# Altium footprint library LPC1788.PCBLIB: 33 footprints (part 2 of 3)
Each footprint in its own frame and in the unit in brackets; x right, y up, seen from the top. Pads: shape width x height; smd on the part's side, far side on the other; paste and mask are expansions set on the pad; w line width, h text height; cw(c..) or ccw(c..) is an arc to the next point about the centre after c.
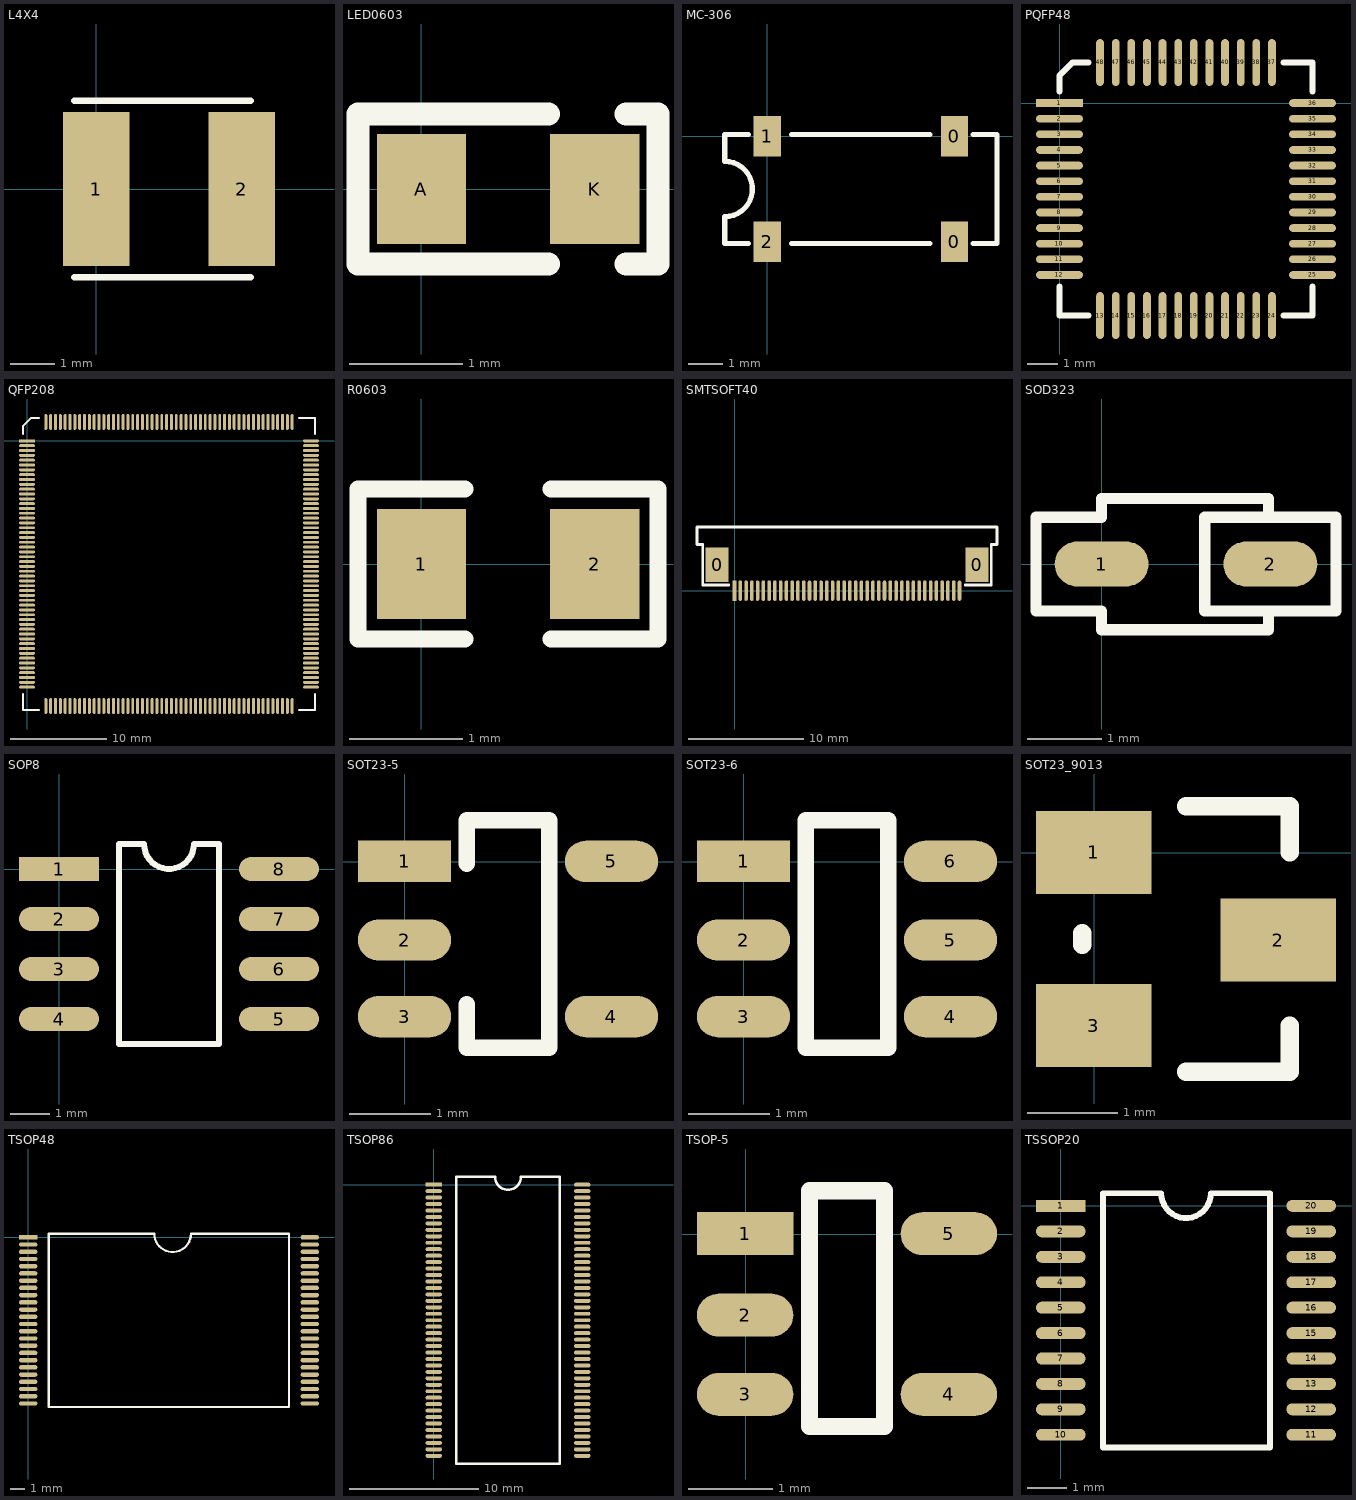
[diagram p1: the footprints below, top view; thin cyan lines are the x and y axes]

## L4X4 [mm]
pads (2):
  rect 1.5x3.5 smd: 1(0,0) 2(3.3,0)
TopOverlay:
  lines w0.152: -0.5,-2 3.5,-2 ; -0.5,2 3.5,2
3D body: height 1.04, standoff 0.02, extent -0.35,-2 3.65,2

## LED0603 [mil]
pads (2):
  rect 31x38 smd: A(0,0) K(60,0)
TopOverlay:
  lines w8: 44,-26 -22,-26 -22,26 44,26 ; 71,-26 82,-26 82,26 71,26
3D body: height 35.43, standoff 0, extent -3.46,-17.71 63.47,17.72

## MC-306 [mm]
pads (4):
  rect 0.8x1.2 smd: 0(5.496,-3.095) 0(5.496,0.005) 1(-0.004,0.005) 2(-0.004,-3.095)
TopOverlay:
  lines w0.152: -0.556,-3.145 -1.254,-3.145 -1.254,-2.359 ccw(c-1.254,-1.545) -1.254,-0.731 -1.254,0.055 -0.556,0.055 ; 0.714,-3.145 4.778,-3.145 ; 0.714,0.055 4.778,0.055 ; 6.048,-3.145 6.746,-3.145 6.746,0.055 6.048,0.055
3D body: height -0.39, standoff -2.8, extent -1.231,-3.248 6.769,0.152

## PQFP48 [mil]
pads (48):
  rect 60x10 smd: 1(-0.17,0.2)
  oval 60x10 smd: 2(-0.17,-19.8) 3(-0.17,-39.8) 4(-0.17,-59.8) 5(-0.17,-79.8) 6(-0.17,-99.8) 7(-0.17,-119.8) 8(-0.17,-139.8) 9(-0.17,-159.8) 10(-0.17,-179.8) 11(-0.17,-199.8) 12(-0.17,-219.8) 25(323.83,-219.8) 26(323.83,-199.8) 27(323.83,-179.8) 28(323.83,-159.8) 29(323.83,-139.8) 30(323.83,-119.8) 31(323.83,-99.8) 32(323.83,-79.8) 33(323.83,-59.8) 34(323.83,-39.8) 35(323.83,-19.8) 36(323.83,0.2)
  oval 10x60 smd: 13(51.83,-271.8) 14(71.83,-271.8) 15(91.83,-271.8) 16(111.83,-271.8) 17(131.83,-271.8) 18(151.83,-271.8) 19(171.83,-271.8) 20(191.83,-271.8) 21(211.83,-271.8) 22(231.83,-271.8) 23(251.83,-271.8) 24(271.83,-271.8) 37(271.83,52.2) 38(251.83,52.2) 39(231.83,52.2) 40(211.83,52.2) 41(191.83,52.2) 42(171.83,52.2) 43(151.83,52.2) 44(131.83,52.2) 45(111.83,52.2) 46(91.83,52.2) 47(71.83,52.2) 48(51.83,52.2)
TopOverlay:
  lines w8: -0.17,-234.8 -0.17,-271.8 36.83,-271.8 ; -0.17,15.2 -0.17,35.2 16.83,52.2 36.83,52.2 ; 286.83,-271.8 323.83,-271.8 323.83,-234.8 ; 286.83,52.2 323.83,52.2 323.83,15.2
3D body: height 57.09, standoff -0.39, extent -15.33,-286.17 339,68.17

## QFP208 [mil]
pads (208):
  rect 65x12 smd: 1(-0.17,0.2)
  oval 65x12 smd: 2(-0.17,-19.48) 3(-0.17,-39.17) 4(-0.17,-58.85) 5(-0.17,-78.54) 6(-0.17,-98.22) 7(-0.17,-117.91) 8(-0.17,-137.59) 9(-0.17,-157.28) 10(-0.17,-176.96) 11(-0.17,-196.65) 12(-0.17,-216.33) 13(-0.17,-236.02) 14(-0.17,-255.7) 15(-0.17,-275.39) 16(-0.17,-295.07) 17(-0.17,-314.76) 18(-0.17,-334.44) 19(-0.17,-354.13) 20(-0.17,-373.81) 21(-0.17,-393.5) 22(-0.17,-413.18) 23(-0.17,-432.87) 24(-0.17,-452.55) 25(-0.17,-472.24) 26(-0.17,-491.92) 27(-0.17,-511.61) 28(-0.17,-531.29) 29(-0.17,-550.98) 30(-0.17,-570.66) 31(-0.17,-590.35) 32(-0.17,-610.03) 33(-0.17,-629.72) 34(-0.17,-649.4) 35(-0.17,-669.09) 36(-0.17,-688.77) 37(-0.17,-708.46) 38(-0.17,-728.14) 39(-0.17,-747.83) 40(-0.17,-767.51) 41(-0.17,-787.2) 42(-0.17,-806.88) 43(-0.17,-826.57) 44(-0.17,-846.25) 45(-0.17,-865.94) 46(-0.17,-885.62) 47(-0.17,-905.31) 48(-0.17,-924.99) 49(-0.17,-944.68) 50(-0.17,-964.36) 51(-0.17,-984.05) 52(-0.17,-1003.73) 105(1157.3,-1003.73) 106(1157.3,-984.05) 107(1157.3,-964.36) 108(1157.3,-944.68) 109(1157.3,-924.99) 110(1157.3,-905.31) 111(1157.3,-885.62) 112(1157.3,-865.94) 113(1157.3,-846.25) 114(1157.3,-826.57) 115(1157.3,-806.88) 116(1157.3,-787.2) 117(1157.3,-767.51) 118(1157.3,-747.83) 119(1157.3,-728.14) 120(1157.3,-708.46) 121(1157.3,-688.77) 122(1157.3,-669.09) 123(1157.3,-649.4) 124(1157.3,-629.72) 125(1157.3,-610.03) 126(1157.3,-590.35) 127(1157.3,-570.66) 128(1157.3,-550.98) 129(1157.3,-531.29) 130(1157.3,-511.61) 131(1157.3,-491.92) 132(1157.3,-472.24) 133(1157.3,-452.55) 134(1157.3,-432.87) 135(1157.3,-413.18) 136(1157.3,-393.5) 137(1157.3,-373.81) 138(1157.3,-354.13) 139(1157.3,-334.44) 140(1157.3,-314.76) 141(1157.3,-295.07) 142(1157.3,-275.39) 143(1157.3,-255.7) 144(1157.3,-236.02) 145(1157.3,-216.33) 146(1157.3,-196.65) 147(1157.3,-176.96) 148(1157.3,-157.28) 149(1157.3,-137.59) 150(1157.3,-117.91) 151(1157.3,-98.22) 152(1157.3,-78.54) 153(1157.3,-58.85) 154(1157.3,-39.17) 155(1157.3,-19.48) 156(1157.3,0.2)
  oval 12x65 smd: 53(76.6,-1080.5) 54(96.28,-1080.5) 55(115.97,-1080.5) 56(135.65,-1080.5) 57(155.34,-1080.5) 58(175.02,-1080.5) 59(194.71,-1080.5) 60(214.39,-1080.5) 61(234.08,-1080.5) 62(253.76,-1080.5) 63(273.45,-1080.5) 64(293.13,-1080.5) 65(312.82,-1080.5) 66(332.5,-1080.5) 67(352.19,-1080.5) 68(371.87,-1080.5) 69(391.56,-1080.5) 70(411.24,-1080.5) 71(430.93,-1080.5) 72(450.61,-1080.5) 73(470.3,-1080.5) 74(489.98,-1080.5) 75(509.67,-1080.5) 76(529.35,-1080.5) 77(549.04,-1080.5) 78(568.72,-1080.5) 79(588.41,-1080.5) 80(608.09,-1080.5) 81(627.78,-1080.5) 82(647.46,-1080.5) 83(667.15,-1080.5) 84(686.83,-1080.5) 85(706.52,-1080.5) 86(726.2,-1080.5) 87(745.89,-1080.5) 88(765.57,-1080.5) 89(785.26,-1080.5) 90(804.94,-1080.5) 91(824.63,-1080.5) 92(844.31,-1080.5) 93(864,-1080.5) 94(883.68,-1080.5) 95(903.37,-1080.5) 96(923.05,-1080.5) 97(942.74,-1080.5) 98(962.42,-1080.5) 99(982.11,-1080.5) 100(1001.79,-1080.5) 101(1021.48,-1080.5) 102(1041.16,-1080.5) 103(1060.85,-1080.5) 104(1080.53,-1080.5) 157(1080.53,76.98) 158(1060.85,76.98) 159(1041.16,76.98) 160(1021.48,76.98) 161(1001.79,76.98) 162(982.11,76.98) 163(962.42,76.98) 164(942.74,76.98) 165(923.05,76.98) 166(903.37,76.98) 167(883.68,76.98) 168(864,76.98) 169(844.31,76.98) 170(824.63,76.98) 171(804.94,76.98) 172(785.26,76.98) 173(765.57,76.98) 174(745.89,76.98) 175(726.2,76.98) 176(706.52,76.98) 177(686.83,76.98) 178(667.15,76.98) 179(647.46,76.98) 180(627.78,76.98) 181(608.09,76.98) 182(588.41,76.98) 183(568.72,76.98) 184(549.04,76.98) 185(529.35,76.98) 186(509.67,76.98) 187(489.98,76.98) 188(470.3,76.98) 189(450.61,76.98) 190(430.93,76.98) 191(411.24,76.98) 192(391.56,76.98) 193(371.87,76.98) 194(352.19,76.98) 195(332.5,76.98) 196(312.82,76.98) 197(293.13,76.98) 198(273.45,76.98) 199(253.76,76.98) 200(234.08,76.98) 201(214.39,76.98) 202(194.71,76.98) 203(175.02,76.98) 204(155.34,76.98) 205(135.65,76.98) 206(115.97,76.98) 207(96.28,76.98) 208(76.6,76.98)
TopOverlay:
  lines w7.87: -15.92,-1031.29 -15.92,-1096.25 49.04,-1096.25 ; -15.92,27.76 -15.92,61.23 15.57,92.72 49.04,92.72 ; 1108.09,-1096.25 1173.05,-1096.25 1173.05,-1031.29 ; 1108.09,92.72 1173.05,92.72 1173.05,27.76
3D body: height 59.84, standoff 0.01, extent -12,-1091 1169.44,90.44

## R0603 [mil]
pads (2):
  rect 31x38 smd: 1(0,0) 2(60,0)
TopOverlay:
  lines w6: 15,-26 -22,-26 -22,26 15,26 ; 45,-26 82,-26 82,26 45,26
3D body: height 21.65, standoff 0, extent -4.44,-18.7 64.45,18.71

## SMTSOFT40 [mil]
pads (42):
  rect 78.74x118.11 smd: 0(-59.23,88.79) 0(826.6,88.79)
  rect 12x70 smd: 1(-0.17,0.2)
  oval 12x70 smd: 2(19.51,0.2) 3(39.2,0.2) 4(58.88,0.2) 5(78.57,0.2) 6(98.25,0.2) 7(117.94,0.2) 8(137.62,0.2) 9(157.31,0.2) 10(176.99,0.2) 11(196.68,0.2) 12(216.36,0.2) 13(236.05,0.2) 14(255.73,0.2) 15(275.42,0.2) 16(295.1,0.2) 17(314.79,0.2) 18(334.47,0.2) 19(354.16,0.2) 20(373.84,0.2) 21(393.53,0.2) 22(413.21,0.2) 23(432.9,0.2) 24(452.58,0.2) 25(472.27,0.2) 26(491.95,0.2) 27(511.64,0.2) 28(531.32,0.2) 29(551.01,0.2) 30(570.69,0.2) 31(590.38,0.2) 32(610.06,0.2) 33(629.75,0.2) 34(649.43,0.2) 35(669.12,0.2) 36(688.8,0.2) 37(708.49,0.2) 38(728.17,0.2) 39(747.86,0.2) 40(767.54,0.2)
TopOverlay:
  lines w10: -19.86,19.89 -108.44,19.89 -108.44,157.69 -128.13,157.69 -128.13,216.74 895.5,216.74 895.5,157.69 875.81,157.69 875.81,19.89 787.23,19.89
3D body: height 87.8, standoff 0.39, extent -121.91,-24.03 889.91,224

## SOD323 [mil]
pads (2):
  oval 50x24 smd: 1(-0.17,0.2) 2(89.83,0.2)
TopOverlay:
  lines w6: 88.83,-24.8 88.83,-34.8 -0.17,-34.8 -0.17,-24.8 -35.17,-24.8 -35.17,25.2 -0.17,25.2 -0.17,35.2 88.83,35.2 88.83,25.2 ; 54.83,-24.8 124.83,-24.8 124.83,25.2 54.83,25.2 54.83,-24.8
3D body: height 39.37, standoff 0, extent -8,-26 94.36,25.18

## SOP8 [mil]
pads (8):
  rect 80x24 smd: 1(0,0)
  oval 80x24 smd: 2(0,-50) 3(0,-100) 4(0,-150) 5(220,-150) 6(220,-100) 7(220,-50) 8(220,0)
TopOverlay:
  lines w6: 60,-175 160,-175 160,25 135,25 cw(c110,25) 85,25 60,25 60,-175
3D body: height 66.93, standoff 0, extent -8.11,-171.45 228.11,21.46

## SOT23-5 [mil]
pads (5):
  rect 45x20 smd: 1(-0.17,0.2)
  oval 45x20 smd: 2(-0.17,-37.8) 3(-0.17,-74.8) 4(99.83,-74.8) 5(99.83,0.2)
TopOverlay:
  lines w8: 29.83,-68.8 29.83,-89.8 69.83,-89.8 69.83,20.2 29.83,20.2 29.83,-0.8
3D body: height 47.24, standoff 0, extent -8.24,-95.09 102,19.09

## SOT23-6 [mil]
pads (6):
  rect 45x20 smd: 1(-0.17,0.2)
  oval 45x20 smd: 2(-0.17,-37.8) 3(-0.17,-74.8) 4(99.83,-74.8) 5(99.83,-37.8) 6(99.83,0.2)
TopOverlay:
  lines w8: 29.83,-89.8 69.83,-89.8 69.83,20.2 29.83,20.2 29.83,-89.8
3D body: height 57.09, standoff 0, extent -6,-95.09 104.24,19.09

## SOT23_9013 [mil]
pads (3):
  rect 50x36 smd: 1(-0.17,0.2) 2(79.83,-37.8) 3(-0.17,-74.8)
TopOverlay:
  lines w8: -5.17,-39.8 -5.17,-34.8 ; 39.83,-94.8 84.83,-94.8 84.83,-74.8 ; 39.83,20.2 84.83,20.2 84.83,0.2
3D body: height 47.24, standoff 0, extent -16,-94 94.23,20.17

## TSOP48 [mil]
pads (48):
  rect 50x12 smd: 1(-0.17,0.2)
  oval 50x12 smd: 2(-0.17,-19.48) 3(-0.17,-39.17) 4(-0.17,-58.85) 5(-0.17,-78.54) 6(-0.17,-98.22) 7(-0.17,-117.91) 8(-0.17,-137.59) 9(-0.17,-157.28) 10(-0.17,-176.96) 11(-0.17,-196.65) 12(-0.17,-216.33) 13(-0.17,-236.02) 14(-0.17,-255.7) 15(-0.17,-275.39) 16(-0.17,-295.07) 17(-0.17,-314.76) 18(-0.17,-334.44) 19(-0.17,-354.13) 20(-0.17,-373.81) 21(-0.17,-393.5) 22(-0.17,-413.18) 23(-0.17,-432.87) 24(-0.17,-452.55) 25(767.23,-452.55) 26(767.23,-432.87) 27(767.23,-413.18) 28(767.23,-393.5) 29(767.23,-373.81) 30(767.23,-354.13) 31(767.23,-334.44) 32(767.23,-314.76) 33(767.23,-295.07) 34(767.23,-275.39) 35(767.23,-255.7) 36(767.23,-236.02) 37(767.23,-216.33) 38(767.23,-196.65) 39(767.23,-176.96) 40(767.23,-157.28) 41(767.23,-137.59) 42(767.23,-117.91) 43(767.23,-98.22) 44(767.23,-78.54) 45(767.23,-58.85) 46(767.23,-39.17) 47(767.23,-19.48) 48(767.23,0.2)
TopOverlay:
  lines w6: 55.91,-462.39 710.14,-462.39 710.14,10.05 443.53,10.05 cw(c393.53,10.05) 343.53,10.05 55.91,10.05 55.91,-462.39
3D body: height 47.24, standoff 0, extent -14.64,-464 780.64,12.38

## TSOP86 [mil]
pads (86):
  rect 50x12 smd: 1(-0.17,0.2)
  oval 50x12 smd: 2(-0.17,-19.48) 3(-0.17,-39.17) 4(-0.17,-58.85) 5(-0.17,-78.54) 6(-0.17,-98.22) 7(-0.17,-117.91) 8(-0.17,-137.59) 9(-0.17,-157.28) 10(-0.17,-176.96) 11(-0.17,-196.65) 12(-0.17,-216.33) 13(-0.17,-236.02) 14(-0.17,-255.7) 15(-0.17,-275.39) 16(-0.17,-295.07) 17(-0.17,-314.76) 18(-0.17,-334.44) 19(-0.17,-354.13) 20(-0.17,-373.81) 21(-0.17,-393.5) 22(-0.17,-413.18) 23(-0.17,-432.87) 24(-0.17,-452.55) 25(-0.17,-472.24) 26(-0.17,-491.92) 27(-0.17,-511.61) 28(-0.17,-531.29) 29(-0.17,-550.98) 30(-0.17,-570.66) 31(-0.17,-590.35) 32(-0.17,-610.03) 33(-0.17,-629.72) 34(-0.17,-649.4) 35(-0.17,-669.09) 36(-0.17,-688.77) 37(-0.17,-708.46) 38(-0.17,-728.14) 39(-0.17,-747.83) 40(-0.17,-767.51) 41(-0.17,-787.2) 42(-0.17,-806.88) 43(-0.17,-826.57) 44(452.58,-826.57) 45(452.58,-806.88) 46(452.58,-787.2) 47(452.58,-767.51) 48(452.58,-747.83) 49(452.58,-728.14) 50(452.58,-708.46) 51(452.58,-688.77) 52(452.58,-669.09) 53(452.58,-649.4) 54(452.58,-629.72) 55(452.58,-610.03) 56(452.58,-590.35) 57(452.58,-570.66) 58(452.58,-550.98) 59(452.58,-531.29) 60(452.58,-511.61) 61(452.58,-491.92) 62(452.58,-472.24) 63(452.58,-452.55) 64(452.58,-432.87) 65(452.58,-413.18) 66(452.58,-393.5) 67(452.58,-373.81) 68(452.58,-354.13) 69(452.58,-334.44) 70(452.58,-314.76) 71(452.58,-295.07) 72(452.58,-275.39) 73(452.58,-255.7) 74(452.58,-236.02) 75(452.58,-216.33) 76(452.58,-196.65) 77(452.58,-176.96) 78(452.58,-157.28) 79(452.58,-137.59) 80(452.58,-117.91) 81(452.58,-98.22) 82(452.58,-78.54) 83(452.58,-58.85) 84(452.58,-39.17) 85(452.58,-19.48) 86(452.58,0.2)
TopOverlay:
  lines w7.87: 68.72,-850.98 383.69,-850.98 383.69,23.83 265.57,23.83 cw(c226.2,23.83) 186.83,23.83 68.72,23.83 68.72,-850.98
3D body: height 51.97, standoff 0, extent -3.99,-851 459,23.8

## TSOP-5 [mil]
pads (5):
  rect 45x20 smd: 1(-0.17,0.2)
  oval 45x20 smd: 2(-0.17,-37.8) 3(-0.17,-74.8) 4(94.83,-74.8) 5(94.83,0.2)
TopOverlay:
  lines w8: 29.83,-89.8 64.83,-89.8 64.83,20.2 29.83,20.2 29.83,-89.8
3D body: height 47.24, standoff 0, extent -10,-94 100.24,20.17

## TSSOP20 [mm]
pads (20):
  rect 1.27x0.305 smd: 1(0,0)
  oval 1.27x0.305 smd: 2(0,-0.65) 3(0,-1.3) 4(0,-1.95) 5(0,-2.6) 6(0,-3.25) 7(0,-3.9) 8(0,-4.55) 9(0,-5.2) 10(0,-5.85) 11(6.4,-5.85) 12(6.4,-5.2) 13(6.4,-4.55) 14(6.4,-3.9) 15(6.4,-3.25) 16(6.4,-2.6) 17(6.4,-1.95) 18(6.4,-1.3) 19(6.4,-0.65) 20(6.4,0)
TopOverlay:
  lines w0.152: 1.073,-6.175 5.352,-6.175 5.352,0.325 3.835,0.325 cw(c3.2,0.325) 2.565,0.325 1.073,0.325 1.073,-6.175
3D body: height 1.2, standoff 0, extent -0.075,-6.225 6.475,0.375